# Altium footprint library lib_datalogger.PcbLib: 866 footprints (part 51 of 55)
Each footprint in its own frame and in the unit in brackets; x right, y up, seen from the top. Pads: shape width x height; smd on the part's side, far side on the other; paste and mask are expansions set on the pad; w line width, h text height; cw(c..) or ccw(c..) is an arc to the next point about the centre after c.
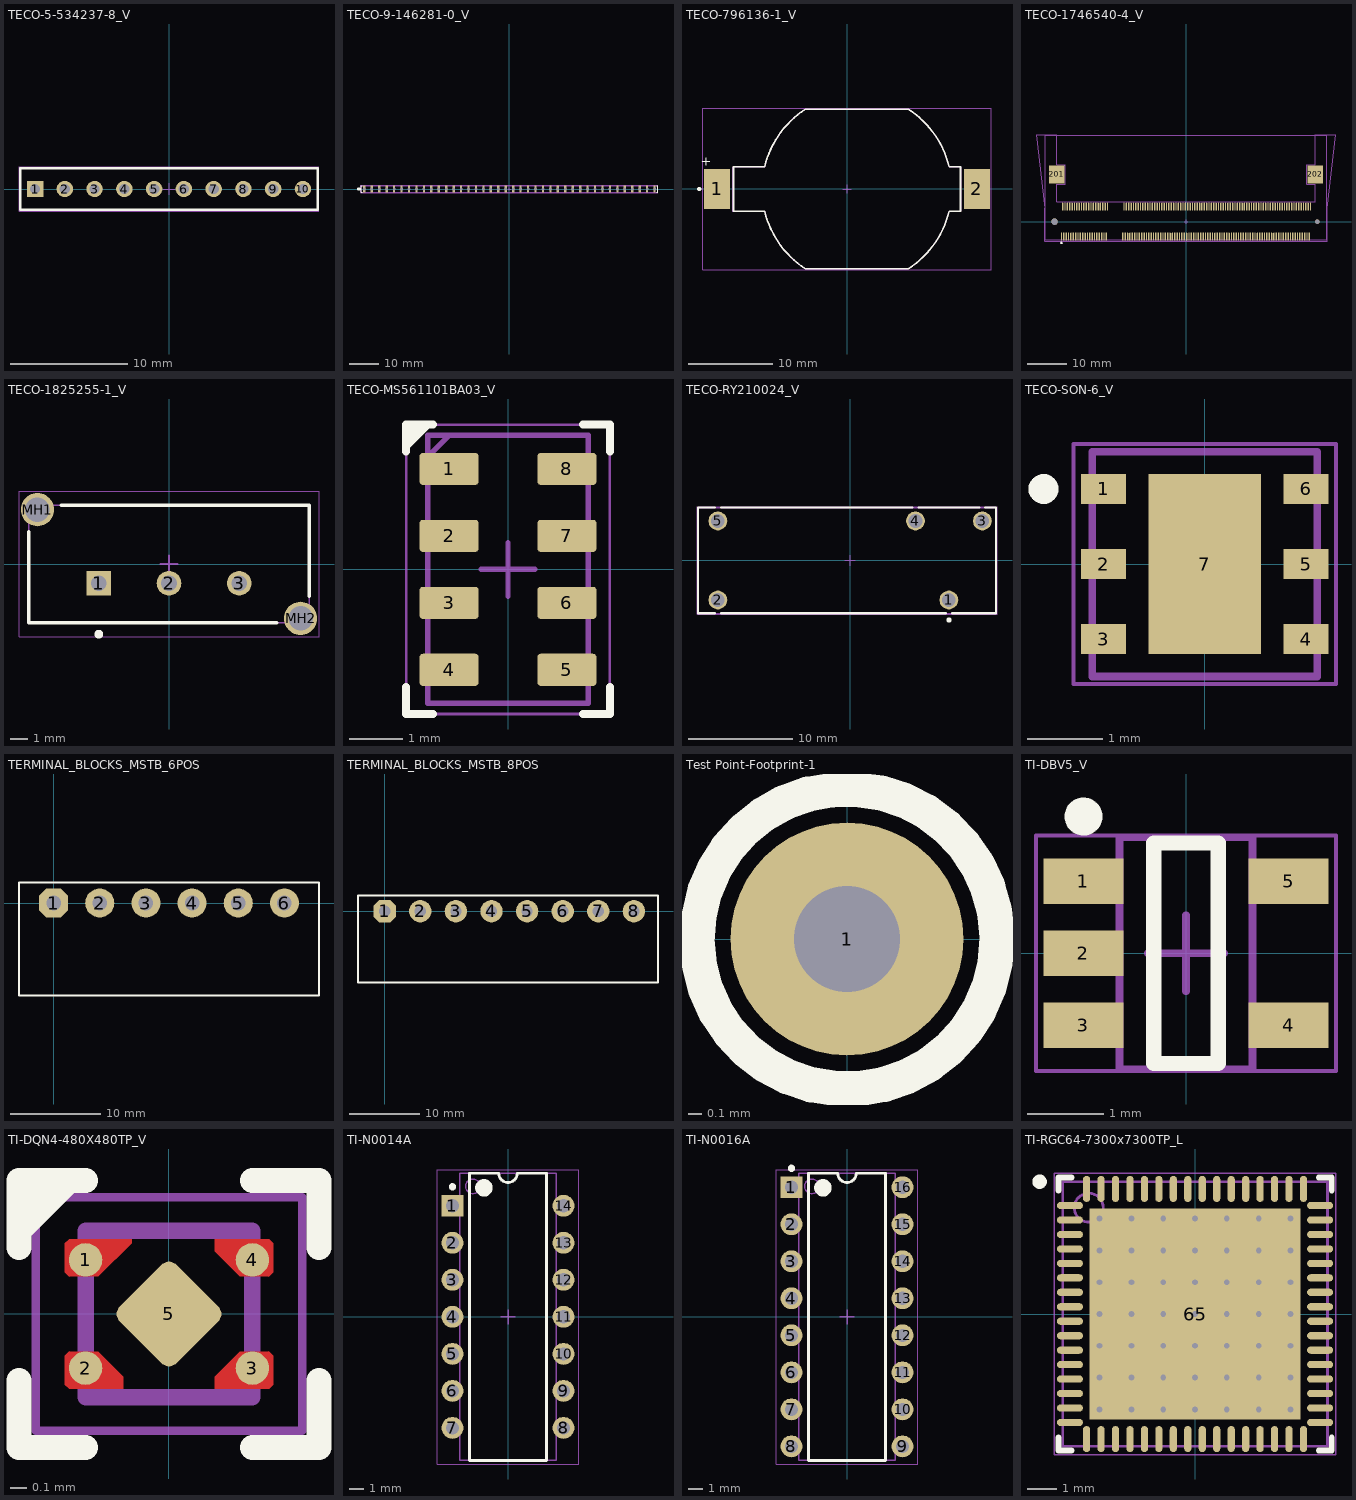
[diagram p50: the footprints below, top view; thin cyan lines are the x and y axes]

## TECO-5-534237-8_V [mm] "Receptacle, 10-Leads, Body 25.4x3.56mm, Pitch 2.54mm"
height 8.64
pads (10):
  rect 1.4x1.4 hole 0.88: 1(-11.43,0)
  round 1.4 hole 0.88: 2(-8.89,0) 3(-6.35,0) 4(-3.81,0) 5(-1.27,0) 6(1.27,0) 7(3.81,0) 8(6.35,0) 9(8.89,0) 10(11.43,0)
Top Overlay:
  lines w0.2: -12.7,-1.78 12.7,-1.78 12.7,1.78 -12.7,1.78 -12.7,-1.78
Mechanical 13:
  lines w0.1: -12.7,-1.778 -12.698,-1.78 12.7,-1.78 12.7,1.78 -12.7,1.78 -12.7,-1.778
Mechanical 15:
  lines w0.05: -12.8,-1.88 -12.8,1.88 12.8,1.88 12.8,-1.88 -12.8,-1.88
  lines w0.1: -0.5,0 0.5,0 ; 0,-0.5 0,0.5
3D body "c-5-534237-8-s-3d.stp": height 8.65, standoff -2.91, extent -12.7,-1.778 12.7,1.778

## TECO-9-146281-0_V [mm] "Header, 40-Leads, Body 101.2x2.34mm, Pitch 2.54mm"
height 8.21
pads (40):
  rect 0.76x2.29 hole 0.89: 1(-49.53,0) 2(-46.99,0) 3(-44.45,0) 4(-41.91,0) 5(-39.37,0) 6(-36.83,0) 7(-34.29,0) 8(-31.75,0) 9(-29.21,0) 10(-26.67,0) 11(-24.13,0) 12(-21.59,0) 13(-19.05,0) 14(-16.51,0) 15(-13.97,0) 16(-11.43,0) 17(-8.89,0) 18(-6.35,0) 19(-3.81,0) 20(-1.27,0) 21(1.27,0) 22(3.81,0) 23(6.35,0) 24(8.89,0) 25(11.43,0) 26(13.97,0) 27(16.51,0) 28(19.05,0) 29(21.59,0) 30(24.13,0) 31(26.67,0) 32(29.21,0) 33(31.75,0) 34(34.29,0) 35(36.83,0) 36(39.37,0) 37(41.91,0) 38(44.45,0) 39(46.99,0) 40(49.53,0)
Top Overlay:
  circle w0.6: c-51.447,0 r0.254
  lines w0.2: -50.309,-1.17 -50.6,-1.17 -50.6,1.17 -50.309,1.17 ; 50.309,-1.17 50.6,-1.17 50.6,1.17 50.309,1.17
Mechanical 13:
  lines w0.1: -50.6,-1.17 50.6,-1.17 50.6,1.17 -50.6,1.17 -50.6,-1.17
Mechanical 15:
  lines w0.05: -50.7,-1.27 -50.7,1.27 50.7,1.27 50.7,-1.27 -50.7,-1.27
  lines w0.1: -0.5,0 0.5,0 ; 0,-0.5 0,0.5
3D body "c-9-146281-0-f-3d.stp": height 8.14, standoff -3.04, extent -50.495,-1.143 50.699,1.143

## TECO-796136-1_V [mm] "SMD, 2-Leads, Body 32.31x19.05mm"
height 6.85
pads (2):
  rect 3.15x4.78 smd: 1(-15.52,0) 2(15.52,0)
Top Overlay:
  circle w0.25: c-17.645,0 r0.125
  lines w0.2: -9.835,-2.665 -13.545,-2.665 -13.545,2.665 -9.835,2.665 cw(c1.18,0) -4.96,9.525 7.32,9.525 cw(c1.18,0) 12.195,2.665 13.545,2.665 13.545,-2.665 12.195,-2.665 ; -9.832,-2.664 ccw(c1.18,0) -4.963,-9.52 7.323,-9.52 ccw(c1.18,0) 12.192,-2.664
  text "+" at -17.471,2.748 h1.15
Mechanical 13:
  lines w0.1: -9.835,-2.665 -13.65,-2.665 -13.65,2.665 -9.835,2.665 cw(c1.18,0) -4.96,9.525 7.32,9.525 cw(c1.18,0) 12.195,2.665 13.65,2.665 13.65,-2.665 12.195,-2.665 ; -9.832,-2.664 ccw(c1.18,0) -4.963,-9.52 7.323,-9.52 ccw(c1.18,0) 12.192,-2.664
Mechanical 15:
  lines w0.05: -17.195,-9.625 17.195,-9.625 17.195,9.625 -17.195,9.625 -17.195,-9.625
  lines w0.1: -0.5,0 0.5,0 ; 0,-0.5 0,0.5
3D body "c-0796136-01-c-3d.stp": height 6.52, standoff -0.01, extent -16.155,-9.525 16.165,9.525

## TECO-1746540-4_V [mm] "SMD, 200-Leads, Body 71.5x26.55mm, Pitch 0.6mm"
height 4.24
pads (204):
  rrect50% 0.35x2 smd: 1(-31.65,-3.8) 2(-31.35,3.8) 3(-31.05,-3.8) 4(-30.75,3.8) 5(-30.45,-3.8) 6(-30.15,3.8) 7(-29.85,-3.8) 8(-29.55,3.8) 9(-29.25,-3.8) 10(-28.95,3.8) 11(-28.65,-3.8) 12(-28.35,3.8) 13(-28.05,-3.8) 14(-27.75,3.8) 15(-27.45,-3.8) 16(-27.15,3.8) 17(-26.85,-3.8) 18(-26.55,3.8) 19(-26.25,-3.8) 20(-25.95,3.8) 21(-25.65,-3.8) 22(-25.35,3.8) 23(-25.05,-3.8) 24(-24.75,3.8) 25(-24.45,-3.8) 26(-24.15,3.8) 27(-23.85,-3.8) 28(-23.55,3.8) 29(-23.25,-3.8) 30(-22.95,3.8) 31(-22.65,-3.8) 32(-22.35,3.8) 33(-22.05,-3.8) 34(-21.75,3.8) 35(-21.45,-3.8) 36(-21.15,3.8) 37(-20.85,-3.8) 38(-20.55,3.8) 39(-20.25,-3.8) 40(-19.95,3.8) 41(-16.05,-3.8) 42(-15.75,3.8) 43(-15.45,-3.8) 44(-15.15,3.8) 45(-14.85,-3.8) 46(-14.55,3.8) 47(-14.25,-3.8) 48(-13.95,3.8) 49(-13.65,-3.8) 50(-13.35,3.8) 51(-13.05,-3.8) 52(-12.75,3.8) 53(-12.45,-3.8) 54(-12.15,3.8) 55(-11.85,-3.8) 56(-11.55,3.8) 57(-11.25,-3.8) 58(-10.95,3.8) 59(-10.65,-3.8) 60(-10.35,3.8) 61(-10.05,-3.8) 62(-9.75,3.8) 63(-9.45,-3.8) 64(-9.15,3.8) 65(-8.85,-3.8) 66(-8.55,3.8) 67(-8.25,-3.8) 68(-7.95,3.8) 69(-7.65,-3.8) 70(-7.35,3.8) 71(-7.05,-3.8) 72(-6.75,3.8) 73(-6.45,-3.8) 74(-6.15,3.8) 75(-5.85,-3.8) 76(-5.55,3.8) 77(-5.25,-3.8) 78(-4.95,3.8) 79(-4.65,-3.8) 80(-4.35,3.8) 81(-4.05,-3.8) 82(-3.75,3.8) 83(-3.45,-3.8) 84(-3.15,3.8) 85(-2.85,-3.8) 86(-2.55,3.8) 87(-2.25,-3.8) 88(-1.95,3.8) 89(-1.65,-3.8) 90(-1.35,3.8) 91(-1.05,-3.8) 92(-0.75,3.8) 93(-0.45,-3.8) 94(-0.15,3.8) 95(0.15,-3.8) 96(0.45,3.8) 97(0.75,-3.8) 98(1.05,3.8) 99(1.35,-3.8) 100(1.65,3.8) 101(1.95,-3.8) 102(2.25,3.8) 103(2.55,-3.8) 104(2.85,3.8) 105(3.15,-3.8) 106(3.45,3.8) 107(3.75,-3.8) 108(4.05,3.8) 109(4.35,-3.8) 110(4.65,3.8) 111(4.95,-3.8) 112(5.25,3.8) 113(5.55,-3.8) 114(5.85,3.8) 115(6.15,-3.8) 116(6.45,3.8) 117(6.75,-3.8) 118(7.05,3.8) 119(7.35,-3.8) 120(7.65,3.8) 121(7.95,-3.8) 122(8.25,3.8) 123(8.55,-3.8) 124(8.85,3.8) 125(9.15,-3.8) 126(9.45,3.8) 127(9.75,-3.8) 128(10.05,3.8) 129(10.35,-3.8) 130(10.65,3.8) 131(10.95,-3.8) 132(11.25,3.8) 133(11.55,-3.8) 134(11.85,3.8) 135(12.15,-3.8) 136(12.45,3.8) 137(12.75,-3.8) 138(13.05,3.8) 139(13.35,-3.8) 140(13.65,3.8) 141(13.95,-3.8) 142(14.25,3.8) 143(14.55,-3.8) 144(14.85,3.8) 145(15.15,-3.8) 146(15.45,3.8) 147(15.75,-3.8) 148(16.05,3.8) 149(16.35,-3.8) 150(16.65,3.8) 151(16.95,-3.8) 152(17.25,3.8) 153(17.55,-3.8) 154(17.85,3.8) 155(18.15,-3.8) 156(18.45,3.8) 157(18.75,-3.8) 158(19.05,3.8) 159(19.35,-3.8) 160(19.65,3.8) 161(19.95,-3.8) 162(20.25,3.8) 163(20.55,-3.8) 164(20.85,3.8) 165(21.15,-3.8) 166(21.45,3.8) 167(21.75,-3.8) 168(22.05,3.8) 169(22.35,-3.8) 170(22.65,3.8) 171(22.95,-3.8) 172(23.25,3.8) 173(23.55,-3.8) 174(23.85,3.8) 175(24.15,-3.8) 176(24.45,3.8) 177(24.75,-3.8) 178(25.05,3.8) 179(25.35,-3.8) 180(25.65,3.8) 181(25.95,-3.8) 182(26.25,3.8) 183(26.55,-3.8) 184(26.85,3.8) 185(27.15,-3.8) 186(27.45,3.8) 187(27.75,-3.8) 188(28.05,3.8) 189(28.35,-3.8) 190(28.65,3.8) 191(28.95,-3.8) 192(29.25,3.8) 193(29.55,-3.8) 194(29.85,3.8) 195(30.15,-3.8) 196(30.45,3.8) 197(30.75,-3.8) 198(31.05,3.8) 199(31.35,-3.8) 200(31.65,3.8)
  rrect5% 3.9x4.6 smd: 201(-32.85,12) 202(32.85,12)
  round 1.6 hole 1.6 unplated: MH1(-33.4,0)
  round 1.1 hole 1.1: MH2(33.4,0)
Top Overlay:
  region: -31.65,-5.055
  region: -31.65,-5.055
  region: -31.65,-5.075 -31.85,-5.475 -31.45,-5.475
  lines w0.15: -31.85,-5.475 -31.45,-5.475 -31.65,-5.075 -31.85,-5.475
Mechanical 13:
  lines w0.1: -35.75,-4.6 35.75,-4.6 35.75,21.95 -35.75,21.95 -35.75,-4.6
Mechanical 15:
  lines w0.05: -38.125,22.05 -35.85,3.4 -35.85,-5 35.85,-5 35.85,3.4 38.125,22.05 32.9,22.05 32.9,14.5 30.7,14.5 30.7,9.5 32.9,9.5 32.9,5 32,5 -32.9,5 -32.9,9.5 -30.7,9.5 -30.7,14.5 -32.9,14.5 -32.9,21.3 -32.9,22.05 -38.125,22.05
  lines w0.1: -0.5,0 0.5,0 ; 0,-0.5 0,0.5
Top Designator:
  text ".Designator" at -1.397,-0.127 h0.6
3D body "c-1746540-4-d1-3d.stp": height 4.22, standoff -0.65, extent -35.75,-4.6 35.75,21.95

## TECO-1825255-1_V [mm] "THD, 5-Leads, Body 6.7x16mm, Pitch 4mm"
height 13
pads (5):
  rect 1.4x1.4 hole 0.9: 1(-4,-1.1)
  round 1.4 hole 0.9: 2(0,-1.1) 3(4,-1.1)
  round 1.9 hole 1.4: MH1(-7.5,3.1) MH2(7.5,-3.1)
Top Overlay:
  circle w0.25: c-4,-4 r0.125
  lines w0.2: -8,1.84 -8,-3.35 6.15,-3.35 ; -6.15,3.35 8,3.35 8,-1.84
Mechanical 13:
  lines w0.1: -8,-3.35 8,-3.35 8,3.35 -8,3.35 -8,-3.35
Mechanical 15:
  lines w0.05: -8.55,-4.15 -8.55,4.15 8.55,4.15 8.55,-4.15 -8.55,-4.15
  lines w0.1: -0.5,0 0.5,0 ; 0,-0.5 0,0.5
3D body "c-1825255-1-a-3d.stp": height 12, standoff -3.5, extent -8,-3.35 8,3.35

## TECO-MS561101BA03_V [mm] "SMD, 8-Leads, Body 3x5mm, Pitch 1.25mm"
height 1
pads (8):
  rrect20% 1.1x0.6 smd: 1(-1.1,1.875) 2(-1.1,0.625) 3(-1.1,-0.625) 4(-1.1,-1.875) 5(1.1,-1.875) 6(1.1,-0.625) 7(1.1,0.625) 8(1.1,1.875)
Top Overlay:
  region: -0.8,2.9
  region: -1.9,2.7 -1.9,2.3 -1.5,2.7
  lines w0.15: -1.9,-2.2 -1.9,-2.7 -1.4,-2.7 ; -1.9,2.2 -1.9,2.7 -1.4,2.7 ; -1.9,2.3 -1.5,2.7 ; 1.4,-2.7 1.9,-2.7 1.9,-2.2 ; 1.4,2.7 1.9,2.7 1.9,2.2
Mechanical 13:
  lines w0.1: -1.5,2.1 -1.1,2.5 ; -1.5,-2.5 -1.5,2.5 1.5,2.5 1.5,-2.5 -1.5,-2.5
Mechanical 15:
  lines w0.05: -1.9,-2.7 -1.9,2.7 1.9,2.7 1.9,-2.7 -1.9,-2.7
  lines w0.1: -0.5,0 0.5,0 ; 0,-0.5 0,0.5
Top Designator:
  text ".Designator" at 0.127,-1.27 h0.6
3D body "ms5611.STEP": height 0.73, standoff 0, extent -1.5,-2.5 1.5,2.5

## TECO-RY210024_V [mm] "THD, 5-Leads, Body 28.5x10.1mm"
height 12.3
pads (5):
  round 1.8 hole 1.3: 1(9.45,-3.78) 2(-12.65,-3.78) 3(12.65,3.78) 4(6.25,3.78) 5(-12.65,3.78)
Top Overlay:
  circle w0.25: c9.45,-5.7 r0.125
  lines w0.2: -12.929,-5.05 -14.55,-5.05 -14.55,5.05 -12.929,5.05 ; -12.371,-5.05 9.171,-5.05 ; -12.371,5.05 5.971,5.05 ; 6.529,5.05 12.371,5.05 ; 9.729,-5.05 13.95,-5.05 ; 12.929,5.05 13.95,5.05 ; 13.95,2.95 13.95,-5.05 ; 13.95,4.45 13.95,5.05 ; 13.95,-5.05 13.95,5.05
Mechanical 13:
  lines w0.1: -14.55,-5.05 -14.55,5.05 13.95,5.05 13.95,-5.05 -14.55,-5.05
Mechanical 15:
  lines w0.05: -14.65,-5.15 14.05,-5.15 14.05,5.15 -14.65,5.15 -14.65,-5.15
  lines w0.1: -0.5,0 0.5,0 ; 0,-0.5 0,0.5
3D body "c-3-1393224-8-a-3d.stp": height 12.31, standoff -3.19, extent -14.55,-5.05 13.95,5.05

## TECO-SON-6_V [mm] "SON, 6-Leads, Body 3x3mm, Pitch 1mm, Thermal Pad 2.4x1.5mm"
height 0.9
pads (7):
  rect 0.6x0.4 smd: 1(-1.35,1) 2(-1.35,0) 3(-1.35,-1) 4(1.35,-1) 5(1.35,0) 6(1.35,1)
  rect 1.5x2.4 smd: 7(0,0)
Top Overlay:
  circle w0.2: c-2.15,1 r0.1
Mechanical 13:
  lines w0.1: -1.5,-1.5 -1.5,1.5 ; -1.5,-1.5 1.5,-1.5 ; -1.5,-1.5 1.5,-1.5 ; -1.5,-1.5 -1.5,1.5 ; -1.5,1.5 1.5,1.5 ; -1.5,1.5 1.5,1.5 ; 1.5,-1.5 1.5,1.5 ; 1.5,-1.5 1.5,1.5
Mechanical 15:
  lines w0.05: -1.75,-1.6 1.75,-1.6 1.75,1.6 -1.75,1.6 -1.75,-1.6
  lines w0.1: -0.5,0 0.5,0 ; 0,-0.5 0,0.5
3D body: height 0.9, standoff 0, extent -1.2,0.2 1.199,1.199
3D body: height 0.5, standoff 0, extent -0.9,0.5 0.899,0.899
3D body: height 1.1, standoff 0, extent -1.5,-1.5 1.499,1.499

## TERMINAL_BLOCKS_MSTB_6POS [mil]
pads (6):
  oct 126x126 hole 63: 1(0,0)
  round 126 hole 63: 2(200,0) 3(400,0) 4(600,0) 5(800,0) 6(1000,0)
Top Overlay:
  lines w10: -150,-401 -150,89 1150,89 1150,-401 -150,-401
3D body "395321006.stp": height 330, standoff -150, extent -139.5,-391 1139.5,79

## TERMINAL_BLOCKS_MSTB_8POS [mil]
pads (8):
  oct 126x126 hole 63: 1(0,0)
  round 126 hole 63: 2(200,0) 3(400,0) 4(600,0) 5(800,0) 6(1000,0) 7(1200,0) 8(1400,0)
Top Overlay:
  lines w10: -150,-401 1535.43,-401 1535.43,89 -150,89 -150,-401
3D body "User Library-Header 8.STEP": height 344.49, standoff -153.54, extent -140.55,-392.72 1538.19,79.73

## Test Point-Footprint-1 [mil]
pads (1):
  round 66 hole 30: 1(0,0)
Top Overlay:
  lines w10: 42.52,0 cw(c0,0) 42.51,1.01

## TI-DBV5_V [mm] "SOT23, 5-Leads, Body 3.05x1.75mm, Pitch 0.95mm"
height 1.45
pads (5):
  rect 1.05x0.6 smd paste-0.025 mask+0.07: 1(-1.35,0.95) 2(-1.35,0) 3(-1.35,-0.95) 4(1.35,-0.95) 5(1.35,0.95)
Top Overlay:
  circle w0.25: c-1.35,1.8 r0.125
  lines w0.2: -0.425,-1.45 -0.425,1.45 0.425,1.45 0.425,-1.45 -0.425,-1.45
Mechanical 13:
  lines w0.1: -0.875,-1.525 0.875,-1.525 0.875,1.525 -0.875,1.525 -0.875,-1.525
Mechanical 15:
  lines w0.05: -1.975,-1.55 -1.975,1.55 1.975,1.55 1.975,-1.55 -1.975,-1.55
  lines w0.1: -0.5,0 0.5,0 ; 0,-0.5 0,0.5
3D body "SOT95P255X145-5L.step": height 1.45, standoff 0, extent -1.5,-1.525 1.5,1.525

## TI-DQN4-480X480TP_V [mm] "SON, 4-Leads, Body 1x1mm, Pitch 0.65mm, Thermal Pad 0.5x0.5mm"
height 0.4
pads (5):
  round 0.2 smd mask+0: 1(-0.5,0.325) 2(-0.5,-0.325) 3(0.5,-0.325) 4(0.5,0.325)
  rrect25% 0.48x0.48 smd rot 45 paste+0.005: 5(0,0)
Top Layer:
  region: -0.275,-0.45 -0.275,-0.375 -0.425,-0.225 -0.6,-0.225 -0.625,-0.25 -0.625,-0.425 -0.6,-0.45
  region: 0.275,-0.45 0.275,-0.375 0.425,-0.225 0.6,-0.225 0.625,-0.25 0.625,-0.425 0.6,-0.45
  region: 0.275,0.45 0.275,0.375 0.425,0.225 0.6,0.225 0.625,0.25 0.625,0.425 0.6,0.45
  region: -0.225,0.45 -0.225,0.425 -0.425,0.225 -0.6,0.225 -0.625,0.25 -0.625,0.425 -0.6,0.45
Top Overlay:
  region: -0.9,0.8 -0.9,0.5 -0.6,0.8
  lines w0.15: -0.9,-0.4 -0.9,-0.8 -0.5,-0.8 ; -0.9,0.4 -0.9,0.8 -0.5,0.8 ; -0.9,0.5 -0.6,0.8 ; 0.5,-0.8 0.9,-0.8 0.9,-0.4 ; 0.5,0.8 0.9,0.8 0.9,0.4
Mechanical 13:
  lines w0.1: -0.5,-0.5 -0.5,0.5 0.5,0.5 0.5,-0.5 -0.5,-0.5
Mechanical 15:
  lines w0.05: -0.203,0 0.203,0 ; 0,-0.203 0,0.203 ; -0.8,-0.7 -0.8,0.7 0.8,0.7 0.8,-0.7 -0.8,-0.7
Top Designator:
  text ".Designator" at -1.27,-0.127 h0.6
3D body: height 0.45, standoff -0.01, extent -2,0.1 -2,0.1
3D body "TI_ DQN_(S-PX2SON-N4)_DQN0004A.STEP": height 0.35, standoff -0.01, extent -0.5,-0.5 0.5,0.5

## TI-N0014A [mm] "DIP, 14-Leads, Body 19.7x6.6mm, Pitch 2.54mm"
height 5.08
pads (14):
  rect 1.5x1.5 hole 0.9: 1(-3.81,7.62)
  round 1.5 hole 0.9: 2(-3.81,5.08) 3(-3.81,2.54) 4(-3.81,0) 5(-3.81,-2.54) 6(-3.81,-5.08) 7(-3.81,-7.62) 8(3.81,-7.62) 9(3.81,-5.08) 10(3.81,-2.54) 11(3.81,0) 12(3.81,2.54) 13(3.81,5.08) 14(3.81,7.62)
Top Overlay:
  circle w0.6: c-1.65,8.85 r0.3
  circle w0.25: c-3.81,8.92 r0.125
  lines w0.2: -2.65,-9.85 2.65,-9.85 2.65,9.85 0.635,9.85 cw(c0,9.85) -0.635,9.85 -2.65,9.85 -2.65,-9.85
Mechanical 13:
  circle w0.1: c-2.4,8.95 r0.5
  lines w0.1: -3.3,-9.85 3.3,-9.85 3.3,9.85 -3.3,9.85 -3.3,-9.85
Mechanical 15:
  lines w0.05: -4.85,-10.1 4.85,-10.1 4.85,10.1 -4.85,10.1 -4.85,-10.1
  lines w0.1: -0.5,0 0.5,0 ; 0,-0.5 0,0.5
3D body: height 5.08, standoff 0.51, extent -3.3,-9.85 3.3,9.85
3D body: height 0, standoff -1.6, extent 3.675,7.26 3.945,7.98
3D body: height 2.93, standoff 2.66, extent 3.3,7.12 3.945,8.12
3D body: height 2.66, standoff 0, extent 3.675,7.12 3.945,8.12
3D body: height 0, standoff -1.6, extent 3.675,4.72 3.945,5.44
3D body: height 2.93, standoff 2.66, extent 3.3,4.58 3.945,5.58
3D body: height 2.66, standoff 0, extent 3.675,4.58 3.945,5.58
3D body: height 0, standoff -1.6, extent 3.675,2.18 3.945,2.9
3D body: height 2.93, standoff 2.66, extent 3.3,2.04 3.945,3.04
3D body: height 2.66, standoff 0, extent 3.675,2.04 3.945,3.04
3D body: height 0, standoff -1.6, extent 3.675,-0.36 3.945,0.36
3D body: height 2.93, standoff 2.66, extent 3.3,-0.5 3.945,0.5
3D body: height 2.66, standoff 0, extent 3.675,-0.5 3.945,0.5
3D body: height 0, standoff -1.6, extent 3.675,-2.9 3.945,-2.18
3D body: height 2.93, standoff 2.66, extent 3.3,-3.04 3.945,-2.04
3D body: height 2.66, standoff 0, extent 3.675,-3.04 3.945,-2.04
3D body: height 0, standoff -1.6, extent 3.675,-5.44 3.945,-4.72
3D body: height 2.93, standoff 2.66, extent 3.3,-5.58 3.945,-4.58
3D body: height 2.66, standoff 0, extent 3.675,-5.58 3.945,-4.58
3D body: height 0, standoff -1.6, extent 3.675,-7.98 3.945,-7.26
3D body: height 2.93, standoff 2.66, extent 3.3,-8.12 3.945,-7.12
3D body: height 2.66, standoff 0, extent 3.675,-8.12 3.945,-7.12
3D body: height 0, standoff -1.6, extent -3.945,-7.98 -3.675,-7.26
3D body: height 2.93, standoff 2.66, extent -3.945,-8.12 -3.3,-7.12
3D body: height 2.66, standoff 0, extent -3.945,-8.12 -3.675,-7.12
3D body: height 0, standoff -1.6, extent -3.945,-5.44 -3.675,-4.72
3D body: height 2.93, standoff 2.66, extent -3.945,-5.58 -3.3,-4.58
3D body: height 2.66, standoff 0, extent -3.945,-5.58 -3.675,-4.58
3D body: height 0, standoff -1.6, extent -3.945,-2.9 -3.675,-2.18
3D body: height 2.93, standoff 2.66, extent -3.945,-3.04 -3.3,-2.04
3D body: height 2.66, standoff 0, extent -3.945,-3.04 -3.675,-2.04
3D body: height 0, standoff -1.6, extent -3.945,-0.36 -3.675,0.36
3D body: height 2.93, standoff 2.66, extent -3.945,-0.5 -3.3,0.5
3D body: height 2.66, standoff 0, extent -3.945,-0.5 -3.675,0.5
3D body: height 0, standoff -1.6, extent -3.945,2.18 -3.675,2.9
3D body: height 2.93, standoff 2.66, extent -3.945,2.04 -3.3,3.04
3D body: height 2.66, standoff 0, extent -3.945,2.04 -3.675,3.04
3D body: height 0, standoff -1.6, extent -3.945,4.72 -3.675,5.44
3D body: height 2.93, standoff 2.66, extent -3.945,4.58 -3.3,5.58
3D body: height 2.66, standoff 0, extent -3.945,4.58 -3.675,5.58
3D body: height 0, standoff -1.6, extent -3.945,7.26 -3.675,7.98
3D body: height 2.93, standoff 2.66, extent -3.945,7.12 -3.3,8.12
3D body: height 2.66, standoff 0, extent -3.945,7.12 -3.675,8.12

## TI-N0016A [mm] "DIP, 16-Leads, Body 19.7x6.6mm, Pitch 2.54mm"
height 5.08
pads (16):
  rect 1.5x1.5 hole 0.9: 1(-3.81,8.89)
  round 1.5 hole 0.9: 2(-3.81,6.35) 3(-3.81,3.81) 4(-3.81,1.27) 5(-3.81,-1.27) 6(-3.81,-3.81) 7(-3.81,-6.35) 8(-3.81,-8.89) 9(3.81,-8.89) 10(3.81,-6.35) 11(3.81,-3.81) 12(3.81,-1.27) 13(3.81,1.27) 14(3.81,3.81) 15(3.81,6.35) 16(3.81,8.89)
Top Overlay:
  circle w0.25: c-3.81,10.19 r0.125
  circle w0.6: c-1.65,8.85 r0.3
  lines w0.2: -2.65,-9.85 -2.65,9.85 -0.635,9.85 ccw(c0,9.85) 0.635,9.85 2.65,9.85 2.65,-9.85 -2.65,-9.85
Mechanical 13:
  circle w0.1: c-2.4,8.95 r0.5
  lines w0.1: -3.3,-9.85 -3.3,9.85 3.3,9.85 3.3,-9.85 -3.3,-9.85
Mechanical 15:
  lines w0.05: -4.85,-10.1 -4.85,10.1 4.85,10.1 4.85,-10.1 -4.85,-10.1
  lines w0.1: -0.5,0 0.5,0 ; 0,-0.5 0,0.5
3D body: height 2.66, standoff 0, extent -3.945,8.39 -3.675,9.39
3D body: height 2.93, standoff 2.66, extent -3.945,8.39 -3.3,9.39
3D body: height 0, standoff -1.6, extent -3.945,8.53 -3.675,9.25
3D body: height 2.66, standoff 0, extent -3.945,5.85 -3.675,6.85
3D body: height 2.93, standoff 2.66, extent -3.945,5.85 -3.3,6.85
3D body: height 0, standoff -1.6, extent -3.945,5.99 -3.675,6.71
3D body: height 2.66, standoff 0, extent -3.945,3.31 -3.675,4.31
3D body: height 2.93, standoff 2.66, extent -3.945,3.31 -3.3,4.31
3D body: height 0, standoff -1.6, extent -3.945,3.45 -3.675,4.17
3D body: height 2.66, standoff 0, extent -3.945,0.77 -3.675,1.77
3D body: height 2.93, standoff 2.66, extent -3.945,0.77 -3.3,1.77
3D body: height 0, standoff -1.6, extent -3.945,0.91 -3.675,1.63
3D body: height 2.66, standoff 0, extent -3.945,-1.77 -3.675,-0.77
3D body: height 2.93, standoff 2.66, extent -3.945,-1.77 -3.3,-0.77
3D body: height 0, standoff -1.6, extent -3.945,-1.63 -3.675,-0.91
3D body: height 2.66, standoff 0, extent -3.945,-4.31 -3.675,-3.31
3D body: height 2.93, standoff 2.66, extent -3.945,-4.31 -3.3,-3.31
3D body: height 0, standoff -1.6, extent -3.945,-4.17 -3.675,-3.45
3D body: height 2.66, standoff 0, extent -3.945,-6.85 -3.675,-5.85
3D body: height 2.93, standoff 2.66, extent -3.945,-6.85 -3.3,-5.85
3D body: height 0, standoff -1.6, extent -3.945,-6.71 -3.675,-5.99
3D body: height 2.66, standoff 0, extent -3.945,-9.39 -3.675,-8.39
3D body: height 2.93, standoff 2.66, extent -3.945,-9.39 -3.3,-8.39
3D body: height 0, standoff -1.6, extent -3.945,-9.25 -3.675,-8.53
3D body: height 2.66, standoff 0, extent 3.675,-9.39 3.945,-8.39
3D body: height 2.93, standoff 2.66, extent 3.3,-9.39 3.945,-8.39
3D body: height 0, standoff -1.6, extent 3.675,-9.25 3.945,-8.53
3D body: height 2.66, standoff 0, extent 3.675,-6.85 3.945,-5.85
3D body: height 2.93, standoff 2.66, extent 3.3,-6.85 3.945,-5.85
3D body: height 0, standoff -1.6, extent 3.675,-6.71 3.945,-5.99
3D body: height 2.66, standoff 0, extent 3.675,-4.31 3.945,-3.31
3D body: height 2.93, standoff 2.66, extent 3.3,-4.31 3.945,-3.31
3D body: height 0, standoff -1.6, extent 3.675,-4.17 3.945,-3.45
3D body: height 2.66, standoff 0, extent 3.675,-1.77 3.945,-0.77
3D body: height 2.93, standoff 2.66, extent 3.3,-1.77 3.945,-0.77
3D body: height 0, standoff -1.6, extent 3.675,-1.63 3.945,-0.91
3D body: height 2.66, standoff 0, extent 3.675,0.77 3.945,1.77
3D body: height 2.93, standoff 2.66, extent 3.3,0.77 3.945,1.77
3D body: height 0, standoff -1.6, extent 3.675,0.91 3.945,1.63
3D body: height 2.66, standoff 0, extent 3.675,3.31 3.945,4.31
3D body: height 2.93, standoff 2.66, extent 3.3,3.31 3.945,4.31
3D body: height 0, standoff -1.6, extent 3.675,3.45 3.945,4.17
3D body: height 2.66, standoff 0, extent 3.675,5.85 3.945,6.85
3D body: height 2.93, standoff 2.66, extent 3.3,5.85 3.945,6.85
3D body: height 0, standoff -1.6, extent 3.675,5.99 3.945,6.71
3D body: height 2.66, standoff 0, extent 3.675,8.39 3.945,9.39
3D body: height 2.93, standoff 2.66, extent 3.3,8.39 3.945,9.39
3D body: height 0, standoff -1.6, extent 3.675,8.53 3.945,9.25
3D body: height 5.08, standoff 0.51, extent -3.3,-9.85 3.3,9.85

## TI-RGC64-7300x7300TP_L [mm] "QFN, 64-Leads, Body 9.15x9.15mm, Pitch 0.50mm, Thermal Pad 7.30x7.30mm, IPC High Density"
height 1
pads (65):
  oval 0.9x0.25 smd: 1(-4.325,3.75) 2(-4.325,3.25) 3(-4.325,2.75) 4(-4.325,2.25) 5(-4.325,1.75) 6(-4.325,1.25) 7(-4.325,0.75) 8(-4.325,0.25) 9(-4.325,-0.25) 10(-4.325,-0.75) 11(-4.325,-1.25) 12(-4.325,-1.75) 13(-4.325,-2.25) 14(-4.325,-2.75) 15(-4.325,-3.25) 16(-4.325,-3.75) 33(4.325,-3.75) 34(4.325,-3.25) 35(4.325,-2.75) 36(4.325,-2.25) 37(4.325,-1.75) 38(4.325,-1.25) 39(4.325,-0.75) 40(4.325,-0.25) 41(4.325,0.25) 42(4.325,0.75) 43(4.325,1.25) 44(4.325,1.75) 45(4.325,2.25) 46(4.325,2.75) 47(4.325,3.25) 48(4.325,3.75)
  oval 0.25x0.9 smd: 17(-3.75,-4.325) 18(-3.25,-4.325) 19(-2.75,-4.325) 20(-2.25,-4.325) 21(-1.75,-4.325) 22(-1.25,-4.325) 23(-0.75,-4.325) 24(-0.25,-4.325) 25(0.25,-4.325) 26(0.75,-4.325) 27(1.25,-4.325) 28(1.75,-4.325) 29(2.25,-4.325) 30(2.75,-4.325) 31(3.25,-4.325) 32(3.75,-4.325) 49(3.75,4.325) 50(3.25,4.325) 51(2.75,4.325) 52(2.25,4.325) 53(1.75,4.325) 54(1.25,4.325) 55(0.75,4.325) 56(0.25,4.325) 57(-0.25,4.325) 58(-0.75,4.325) 59(-1.25,4.325) 60(-1.75,4.325) 61(-2.25,4.325) 62(-2.75,4.325) 63(-3.25,4.325) 64(-3.75,4.325)
  rect 7.3x7.3 smd: 65(0,0)
via 3.3,-3.3 diameter 0.5 hole 0.2
via 2.2,-3.3 diameter 0.5 hole 0.2
via 1.1,-3.3 diameter 0.5 hole 0.2
via 0,-3.3 diameter 0.5 hole 0.2
via -1.1,-3.3 diameter 0.5 hole 0.2
via -2.2,-3.3 diameter 0.5 hole 0.2
via -3.3,-3.3 diameter 0.5 hole 0.2
via 3.3,-2.2 diameter 0.5 hole 0.2
via 2.2,-2.2 diameter 0.5 hole 0.2
via 1.1,-2.2 diameter 0.5 hole 0.2
via 0,-2.2 diameter 0.5 hole 0.2
via -1.1,-2.2 diameter 0.5 hole 0.2
via -2.2,-2.2 diameter 0.5 hole 0.2
via -3.3,-2.2 diameter 0.5 hole 0.2
via 3.3,-1.1 diameter 0.5 hole 0.2
via 2.2,-1.1 diameter 0.5 hole 0.2
via 1.1,-1.1 diameter 0.5 hole 0.2
via 0,-1.1 diameter 0.5 hole 0.2
via -1.1,-1.1 diameter 0.5 hole 0.2
via -2.2,-1.1 diameter 0.5 hole 0.2
via -3.3,-1.1 diameter 0.5 hole 0.2
via 3.3,0 diameter 0.5 hole 0.2
via 2.2,0 diameter 0.5 hole 0.2
via 1.1,0 diameter 0.5 hole 0.2
via 0,0 diameter 0.5 hole 0.2
via -1.1,0 diameter 0.5 hole 0.2
via -2.2,0 diameter 0.5 hole 0.2
via -3.3,0 diameter 0.5 hole 0.2
via 3.3,1.1 diameter 0.5 hole 0.2
via 2.2,1.1 diameter 0.5 hole 0.2
via 1.1,1.1 diameter 0.5 hole 0.2
via 0,1.1 diameter 0.5 hole 0.2
via -1.1,1.1 diameter 0.5 hole 0.2
via -2.2,1.1 diameter 0.5 hole 0.2
via -3.3,1.1 diameter 0.5 hole 0.2
via 3.3,2.2 diameter 0.5 hole 0.2
via 2.2,2.2 diameter 0.5 hole 0.2
via 1.1,2.2 diameter 0.5 hole 0.2
via 0,2.2 diameter 0.5 hole 0.2
via -1.1,2.2 diameter 0.5 hole 0.2
via -2.2,2.2 diameter 0.5 hole 0.2
via -3.3,2.2 diameter 0.5 hole 0.2
via 3.3,3.3 diameter 0.5 hole 0.2
via 2.2,3.3 diameter 0.5 hole 0.2
via 1.1,3.3 diameter 0.5 hole 0.2
via 0,3.3 diameter 0.5 hole 0.2
via -1.1,3.3 diameter 0.5 hole 0.2
via -2.2,3.3 diameter 0.5 hole 0.2
via -3.3,3.3 diameter 0.5 hole 0.2
Top Overlay:
  circle w0.25: c-5.375,4.575 r0.125
  lines w0.2: -4.725,-4.275 -4.725,-4.725 -4.275,-4.725 ; -4.725,4.275 -4.725,4.725 -4.275,4.725 ; 4.275,-4.725 4.725,-4.725 4.725,-4.275 ; 4.275,4.725 4.725,4.725 4.725,4.275
Mechanical 13:
  circle w0.1: c-3.675,3.675 r0.5
  lines w0.1: -4.575,-4.575 4.575,-4.575 4.575,4.575 -4.575,4.575 -4.575,-4.575
Mechanical 15:
  lines w0.05: -4.875,-4.875 4.875,-4.875 4.875,4.875 -4.875,4.875 -4.875,-4.875
  lines w0.1: -0.5,0 0.5,0 ; 0,-0.5 0,0.5
3D body "PQFN50P900X900X100_HS-65N.step": height 1, standoff 0, extent -4.575,-4.575 4.575,4.575